# Altium footprint library Inductors.PcbLib: 70 footprints (part 4 of 5)
Each footprint in its own frame and in the unit in brackets; x right, y up, seen from the top. Pads: shape width x height; smd on the part's side, far side on the other; paste and mask are expansions set on the pad; w line width, h text height; cw(c..) or ccw(c..) is an arc to the next point about the centre after c.
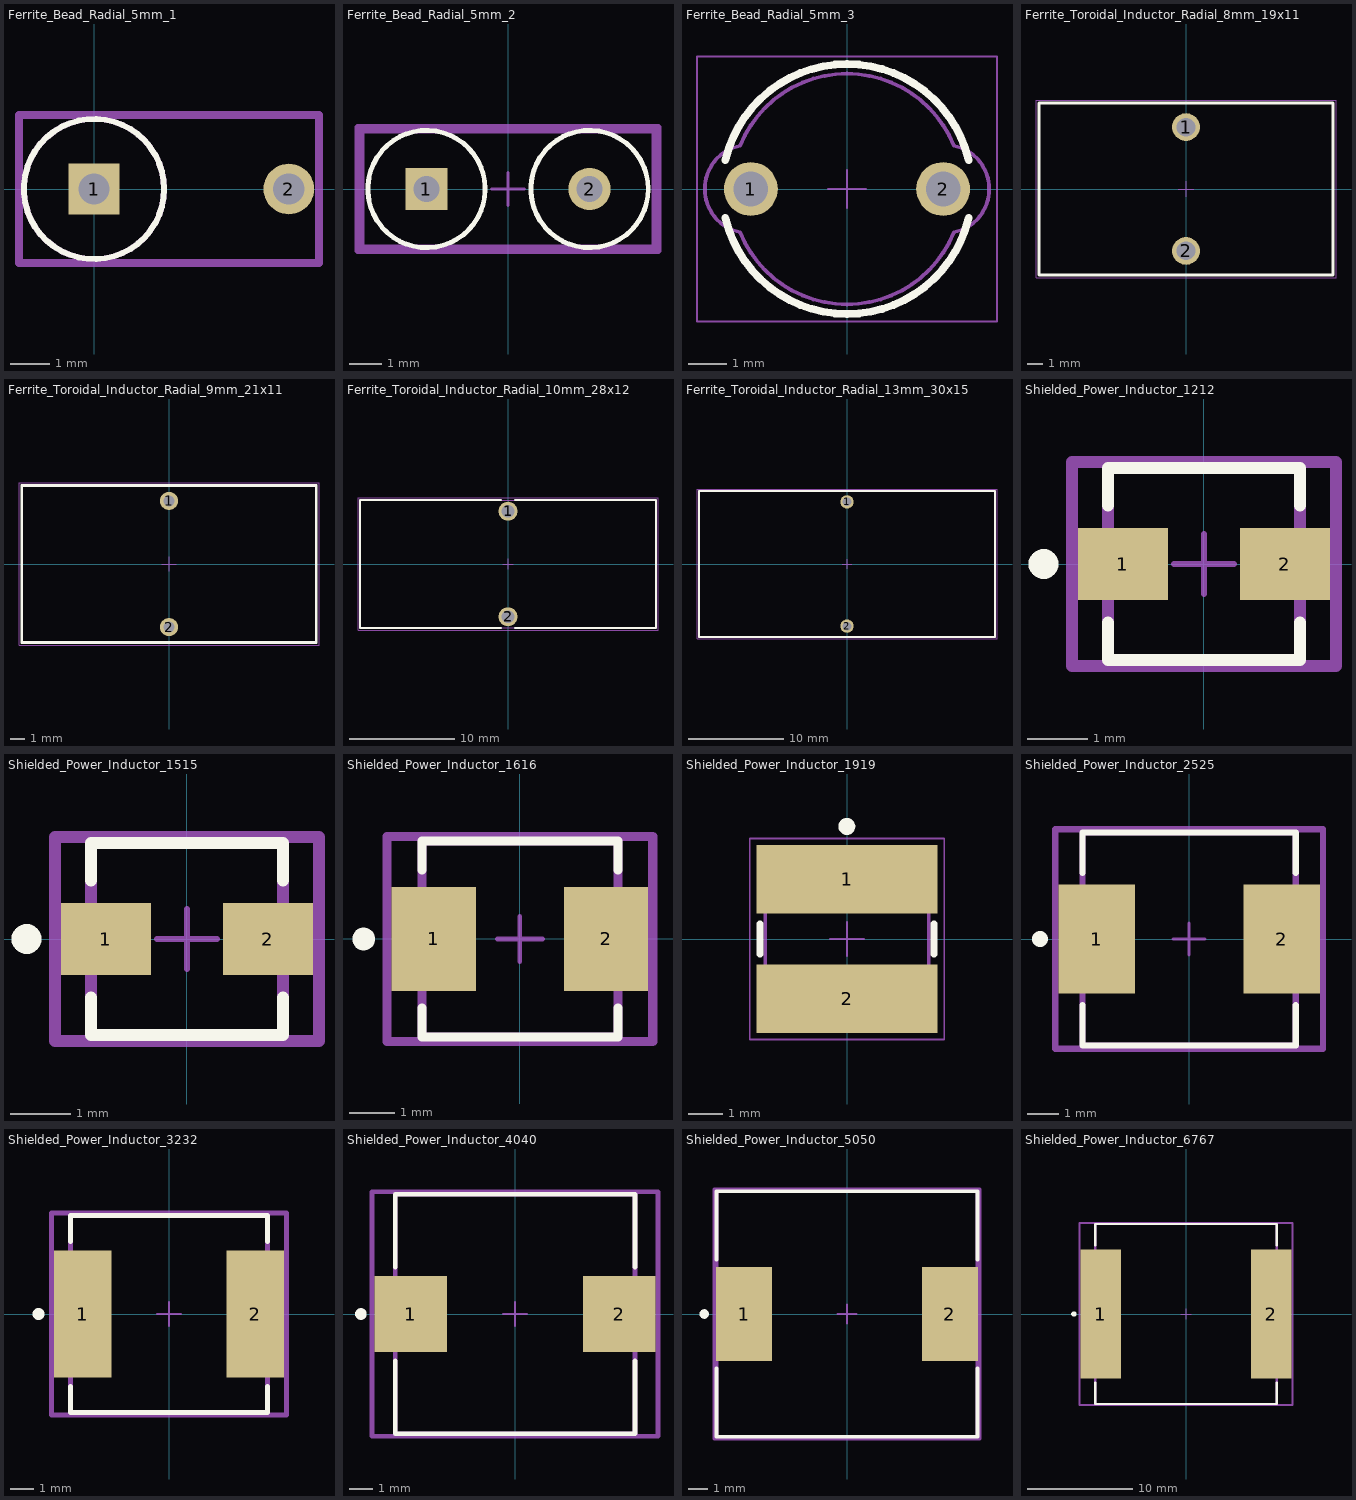
[diagram p3: the footprints below, top view; thin cyan lines are the x and y axes]

## Ferrite_Bead_Radial_5mm_1 [mm]
pads (2):
  rect 1.3x1.3 hole 0.8 paste-2539.97 mask+0: 1(0,0)
  round 1.3 hole 0.8 paste-2539.97 mask+0: 2(5,0)
Top Overlay:
  circle w0.15: c0,0 r1.8
Top Component Center:
  lines w0.1: -0.5,0 0.5,0 ; 0,-0.5 0,0.5
Top Assembly:
  lines w0.2: -1.925,-1.9 -1.925,1.9 5.775,1.9 5.775,-1.9 -1.925,-1.9
Top 3D Body:
  circle w0.15: c0,0 r1.8
Top Courtyard:
  lines w0.2: -1.925,-1.9 -1.925,1.9 5.775,1.9 5.775,-1.9 -1.925,-1.9
3D body "FBead_Murata_BL02RN1R2M2B_eec.STEP": height 0.25, standoff 0, extent -1.925,-1.9 5.775,1.9

## Ferrite_Bead_Radial_5mm_2 [mm]
pads (2):
  rect 1.3x1.3 hole 0.8 paste-2539.97 mask+0: 1(-2.5,0)
  round 1.3 hole 0.8 paste-2539.97 mask+0: 2(2.5,0)
Top Overlay:
  circle w0.15: c2.5,0 r1.8
  circle w0.15: c-2.5,0 r1.8
Top Component Center:
  lines w0.1: -0.5,0 0.5,0 ; 0,-0.5 0,0.5
Top Assembly:
  lines w0.2: -4.6,-1.9 -4.6,1.9 4.6,1.9 4.6,-1.9 -4.6,-1.9
Top 3D Body:
  lines w0.2: -4.5,-1.8 -4.5,1.8 4.5,1.8 4.5,-1.8 -4.5,-1.8
Top Courtyard:
  lines w0.2: -4.6,-1.9 -4.6,1.9 4.6,1.9 4.6,-1.9 -4.6,-1.9
3D body "FBead_Murata_BL02RN2R1M2B_eec.STEP": height 0.25, standoff 0, extent -4.6,-1.9 4.6,1.9

## Ferrite_Bead_Radial_5mm_3 [mm] "EMI Suppression 6-Hole Ferrite Bead, body diameter 6mm"
height 15
pads (2):
  round 1.4 hole 0.9: 1(-2.5,0) 2(2.5,0)
Top Overlay:
  lines w0.2: -3.162,-0.753 ccw(c0,0) 3.162,-0.753 ; -3.162,0.753 cw(c0,0) 3.162,0.753
Top Component Outline:
  lines w0.1: -2.78,-1.127 ccw(c0,0) 2.78,-1.127 ccw(c2.55,0) 2.78,1.127 ccw(c0,0) -2.78,1.127 ccw(c-2.55,0) -2.78,-1.127
Top 3D Body:
  lines w0.1: -2.78,-1.127 ccw(c0,0) 2.78,-1.127 ccw(c2.55,0) 2.78,1.127 ccw(c0,0) -2.78,1.127 ccw(c-2.55,0) -2.78,-1.127
Top Courtyard:
  lines w0.05: -0.5,0 0.5,0 ; 0,-0.5 0,0.5 ; -3.9,-3.45 3.9,-3.45 3.9,3.45 -3.9,3.45 -3.9,-3.45
3D body "74275223.stp": height 15.09, standoff -3.41, extent -4.243,-4.243 4.243,4.243

## Ferrite_Toroidal_Inductor_Radial_8mm_19x11 [mm]
height 19
pads (2):
  round 1.8 hole 1.2: 1(0,4) 2(0,-4)
Top Overlay:
  lines w0.2: -9.5,-5.55 -9.5,5.55 9.5,5.55 9.5,-5.55 -9.5,-5.55
Top Component Outline:
  lines w0.1: -9.5,-5.55 -9.5,5.55 9.5,5.55 9.5,-5.55 -9.5,-5.55
Top 3D Body:
  lines w0.1: -9.5,-5.55 9.5,-5.55 9.5,5.55 -9.5,5.55 -9.5,-5.55
Top Courtyard:
  lines w0.05: -0.5,0 0.5,0 ; 0,-0.5 0,0.5 ; -9.7,-5.75 -9.7,5.75 9.7,5.75 9.7,-5.75 -9.7,-5.75
3D body "7447016.stp": height 17.21, standoff -14.81, extent -8.708,-4.5 8.707,4.499

## Ferrite_Toroidal_Inductor_Radial_9mm_21x11 [mm]
height 21
pads (2):
  round 1.3 hole 0.8: 1(0,4.5) 2(0,-4.5)
Top Overlay:
  lines w0.2: -10.5,-5.6 10.5,-5.6 10.5,5.6 -10.5,5.6 -10.5,-5.6
Top Component Outline:
  lines w0.1: -10.5,-5.6 10.5,-5.6 10.5,5.6 -10.5,5.6 -10.5,-5.6
Top 3D Body:
  lines w0.1: -10.5,-5.6 -10.5,5.6 10.5,5.6 10.5,-5.6 -10.5,-5.6
Top Courtyard:
  lines w0.05: -0.5,0 0.5,0 ; 0,-0.5 0,0.5 ; -10.7,-5.8 10.7,-5.8 10.7,5.8 -10.7,5.8 -10.7,-5.8
3D body "7447060.stp": height 18.76, standoff -24.85, extent -9.458,-4.799 9.459,4.8

## Ferrite_Toroidal_Inductor_Radial_10mm_28x12 [mm]
height 28
pads (2):
  round 1.8 hole 1.2: 1(0,5) 2(0,-5)
Top Overlay:
  lines w0.2: -0.65,-6.05 -14,-6.05 -14,6.05 -0.65,6.05 ; 0.65,-6.05 14,-6.05 14,6.05 0.65,6.05
Top Component Outline:
  lines w0.1: -14,-6.05 14,-6.05 14,6.05 -14,6.05 -14,-6.05
Top 3D Body:
  lines w0.1: -14,-6.05 -14,6.05 14,6.05 14,-6.05 -14,-6.05
Top Courtyard:
  lines w0.05: -0.5,0 0.5,0 ; 0,-0.5 0,0.5 ; -14.2,-6.25 14.2,-6.25 14.2,6.25 -14.2,6.25 -14.2,-6.25
3D body "744152.stp": height 25.56, standoff -11.95, extent -13.06,-5.499 13.059,5.499

## Ferrite_Toroidal_Inductor_Radial_13mm_30x15 [mm]
height 31
pads (2):
  round 1.4 hole 0.9: 1(0,6.5) 2(0,-6.5)
Top Overlay:
  lines w0.2: -15.5,-7.65 -15.5,7.65 15.5,7.65 15.5,-7.65 -15.5,-7.65
Top Component Outline:
  lines w0.1: -15.5,-7.65 -15.5,7.65 15.5,7.65 15.5,-7.65 -15.5,-7.65
Top 3D Body:
  lines w0.1: -15.5,-7.65 15.5,-7.65 15.5,7.65 -15.5,7.65 -15.5,-7.65
Top Courtyard:
  lines w0.05: -0.5,0 0.5,0 ; 0,-0.5 0,0.5 ; -15.7,-7.85 -15.7,7.85 15.7,7.85 15.7,-7.85 -15.7,-7.85
3D body "744136.stp": height 28.36, standoff -11.95, extent -14.258,-6.849 14.259,6.849

## Shielded_Power_Inductor_1212 [mm]
pads (2):
  rect 1.5x1.2 smd paste+0 mask+0: 1(-1.35,0) 2(1.35,0)
Top Overlay:
  circle w0.25: c-2.674,0 r0.125
  lines w0.2: -1.6,-0.975 -1.6,-1.6 1.6,-1.6 1.6,-0.975 ; -1.6,0.975 -1.6,1.6 1.6,1.6 1.6,0.975
Top Component Center:
  lines w0.1: -0.5,0 0.5,0 ; 0,-0.5 0,0.5
Top Assembly:
  lines w0.2: -2.2,-1.7 2.2,-1.7 2.2,1.7 -2.2,1.7 -2.2,-1.7
Top 3D Body:
  lines w0.2: -1.6,-1.6 1.6,-1.6 1.6,1.6 -1.6,1.6 -1.6,-1.6
Top Courtyard:
  lines w0.2: -2.2,-1.7 2.2,-1.7 2.2,1.7 -2.2,1.7 -2.2,-1.7
3D body "Ind_Vishay_IHLP1212AEERR47M11_eec.STEP": height 0.25, standoff 0, extent -2.2,-1.7 2.2,1.7

## Shielded_Power_Inductor_1515 [mm]
pads (2):
  rect 1.5x1.2 smd paste+0 mask+0: 1(-1.35,0) 2(1.35,0)
Top Overlay:
  circle w0.25: c-2.674,0 r0.125
  lines w0.2: -1.6,-0.975 -1.6,-1.6 1.6,-1.6 1.6,-0.975 ; -1.6,0.975 -1.6,1.6 1.6,1.6 1.6,0.975
Top Component Center:
  lines w0.1: -0.5,0 0.5,0 ; 0,-0.5 0,0.5
Top Assembly:
  lines w0.2: -2.2,-1.7 -2.2,1.7 2.2,1.7 2.2,-1.7 -2.2,-1.7
Top 3D Body:
  lines w0.2: -1.6,-1.6 -1.6,1.6 1.6,1.6 1.6,-1.6 -1.6,-1.6
Top Courtyard:
  lines w0.2: -2.2,-1.7 -2.2,1.7 2.2,1.7 2.2,-1.7 -2.2,-1.7
3D body "Ind_Vishay_IHLP1212AEERR47M11_eec.STEP": height 0.25, standoff 0, extent -2.2,-1.7 2.2,1.7

## Shielded_Power_Inductor_1616 [mil]
pads (2):
  rect 73.01x90 smd paste+0 mask+0: 1(-74.5,0) 2(74.5,0)
Top Overlay:
  circle w9.84: c-135.28,0 r4.92
  lines w7.87: -84.92,-59.76 -84.92,-84.92 84.92,-84.92 84.92,-59.76 ; -84.92,59.76 -84.92,84.92 84.92,84.92 84.92,59.76
Top Component Center:
  lines w3.94: -19.68,0 19.68,0 ; 0,-19.68 0,19.68
Top Assembly:
  lines w7.87: -114.94,-88.86 114.94,-88.86 114.94,88.86 -114.94,88.86 -114.94,-88.86
Top 3D Body:
  lines w7.87: -84.92,-84.92 84.92,-84.92 84.92,84.92 -84.92,84.92 -84.92,-84.92
Top Courtyard:
  lines w7.87: -114.94,-88.86 114.94,-88.86 114.94,88.86 -114.94,88.86 -114.94,-88.86
3D body "Ind_Vishay_IHLP1616BZER1R0M5A_eec.STEP": height 10, standoff 0, extent -114.94,-88.86 114.94,88.86

## Shielded_Power_Inductor_1919 [mm]
height 2.8
pads (2):
  rect 5.3x2 smd: 1(0,1.75) 2(0,-1.75)
Top Overlay:
  circle w0.25: c-0.007,3.302 r0.125
  lines w0.2: -2.55,-0.45 -2.55,0.45 ; 2.55,-0.45 2.55,0.45
Top Component Outline:
  circle w0.1: c0,1.6 r0.3
  lines w0.1: -2.4,-2.4 2.4,-2.4 2.4,2.4 -2.4,2.4 -2.4,-2.4
Top 3D Body:
  circle w0.1: c0,1.6 r0.3
  lines w0.1: -2.4,-2.4 2.4,-2.4 2.4,2.4 -2.4,2.4 -2.4,-2.4
Top Courtyard:
  lines w0.05: -0.5,0 0.5,0 ; 0,-0.5 0,0.5 ; -2.85,-2.95 2.85,-2.95 2.85,2.95 -2.85,2.95 -2.85,-2.95
3D body "74408942xx.stp": height 2.8, standoff -0.01, extent -2.41,-2.41 2.41,2.41

## Shielded_Power_Inductor_2525 [mil]
pads (2):
  rect 95x135 smd paste+0 mask+0: 1(-115,0) 2(115,0)
Top Overlay:
  circle w9.84: c-185.28,0 r4.92
  lines w7.87: -132.36,-82.26 -132.36,-132.36 132.36,-132.36 132.36,-82.26 ; -132.36,82.26 -132.36,132.36 132.36,132.36 132.36,82.26
Top Component Center:
  lines w3.94: -19.68,0 19.68,0 ; 0,-19.68 0,19.68
Top Assembly:
  lines w7.87: -166.44,-136.3 166.44,-136.3 166.44,136.3 -166.44,136.3 -166.44,-136.3
Top 3D Body:
  lines w7.87: -132.36,-132.36 132.36,-132.36 132.36,132.36 -132.36,132.36 -132.36,-132.36
Top Courtyard:
  lines w7.87: -166.44,-136.3 166.44,-136.3 166.44,136.3 -166.44,136.3 -166.44,-136.3
3D body "Ind_Vishay_IHLP2525CZER1R5M5A_eec.STEP": height 10, standoff 0, extent -166.44,-136.3 166.44,136.3

## Shielded_Power_Inductor_3232 [mil]
pads (2):
  rect 95x210 smd paste+0 mask+0: 1(-142.5,0) 2(142.5,0)
Top Overlay:
  circle w9.84: c-215.28,0 r4.92
  lines w7.87: -162.52,-119.76 -162.52,-162.52 162.52,-162.52 162.52,-119.76 ; -162.52,119.76 -162.52,162.52 162.52,162.52 162.52,119.76
Top Component Center:
  lines w3.94: -19.68,0 19.68,0 ; 0,-19.68 0,19.68
Top Assembly:
  lines w7.87: -193.94,-166.46 193.94,-166.46 193.94,166.46 -193.94,166.46 -193.94,-166.46
Top 3D Body:
  lines w7.87: -162.52,-162.52 162.52,-162.52 162.52,162.52 -162.52,162.52 -162.52,-162.52
Top Courtyard:
  lines w7.87: -193.94,-166.46 193.94,-166.46 193.94,166.46 -193.94,166.46 -193.94,-166.46
3D body "Ind_Vishay_IHLP3232DZER4R7M11_eec.STEP": height 10, standoff 0, extent -193.94,-166.46 193.94,166.46

## Shielded_Power_Inductor_4040 [mm]
pads (2):
  rect 3.124x3.251 smd paste+0 mask+0: 1(-4.47,0) 2(4.47,0)
Top Overlay:
  circle w0.25: c-6.611,0 r0.125
  lines w0.2: -5.143,-2 -5.143,-5.143 5.143,-5.143 5.143,-2 ; -5.143,2 -5.143,5.143 5.143,5.143 5.143,2
Top Component Center:
  lines w0.1: -0.5,0 0.5,0 ; 0,-0.5 0,0.5
Top Assembly:
  lines w0.2: -6.132,-5.243 6.132,-5.243 6.132,5.243 -6.132,5.243 -6.132,-5.243
Top 3D Body:
  lines w0.2: -5.143,-5.143 5.143,-5.143 5.143,5.143 -5.143,5.143 -5.143,-5.143
Top Courtyard:
  lines w0.2: -6.132,-5.243 6.132,-5.243 6.132,5.243 -6.132,5.243 -6.132,-5.243
3D body "Ind_Vishay_IHLP4040DZER4R7M5A_eec.STEP": height 0.25, standoff 0, extent -6.132,-5.243 6.132,5.243

## Shielded_Power_Inductor_5050 [mm]
pads (2):
  rect 2.945x4.95 smd paste+0 mask+0: 1(-5.407,0) 2(5.407,0)
Top Overlay:
  circle w0.25: c-7.5,0 r0.125
  lines w0.2: -6.85,-2.85 -6.85,-6.45 6.85,-6.45 6.85,-2.85 ; -6.85,2.85 -6.85,6.45 6.85,6.45 6.85,2.85
Top Component Center:
  lines w0.1: -0.5,0 0.5,0 ; 0,-0.5 0,0.5
Top Assembly:
  lines w0.2: -6.98,-6.55 -6.98,6.55 6.98,6.55 6.98,-6.55 -6.98,-6.55
Top 3D Body:
  lines w0.2: -6.85,-6.45 -6.85,6.45 6.85,6.45 6.85,-6.45 -6.85,-6.45
Top Courtyard:
  lines w0.2: -6.98,-6.55 -6.98,6.55 6.98,6.55 6.98,-6.55 -6.98,-6.55
3D body "Ind_Vishay_IHLP5050FDRZ1R8M01_eec.STEP": height 0.25, standoff 0, extent -6.98,-6.55 6.98,6.55

## Shielded_Power_Inductor_6767 [mm]
pads (2):
  rect 3.825x12.32 smd paste+0 mask+0: 1(-8.117,0) 2(8.117,0)
Top Overlay:
  circle w0.25: c-10.675,0 r0.125
  lines w0.2: -8.638,-6.535 -8.638,-8.575 8.638,-8.575 8.638,-6.535 ; -8.638,6.535 -8.638,8.575 8.638,8.575 8.638,6.535
Top Component Center:
  lines w0.1: -0.5,0 0.5,0 ; 0,-0.5 0,0.5
Top Assembly:
  lines w0.2: -10.13,-8.675 10.13,-8.675 10.13,8.675 -10.13,8.675 -10.13,-8.675
Top 3D Body:
  lines w0.2: -8.638,-8.575 8.638,-8.575 8.638,8.575 -8.638,8.575 -8.638,-8.575
Top Courtyard:
  lines w0.2: -10.13,-8.675 10.13,-8.675 10.13,8.675 -10.13,8.675 -10.13,-8.675
3D body "Ind_Vishay_IHLP6767GZER1R5M11_eec.STEP": height 0.25, standoff 0, extent -10.13,-8.675 10.13,8.675